# Altium footprint library CAD_Footprints.PcbLib: 27 footprints (part 2 of 2)
Each footprint in its own frame and in the unit in brackets; x right, y up, seen from the top. Pads: shape width x height; smd on the part's side, far side on the other; paste and mask are expansions set on the pad; w line width, h text height; cw(c..) or ccw(c..) is an arc to the next point about the centre after c.
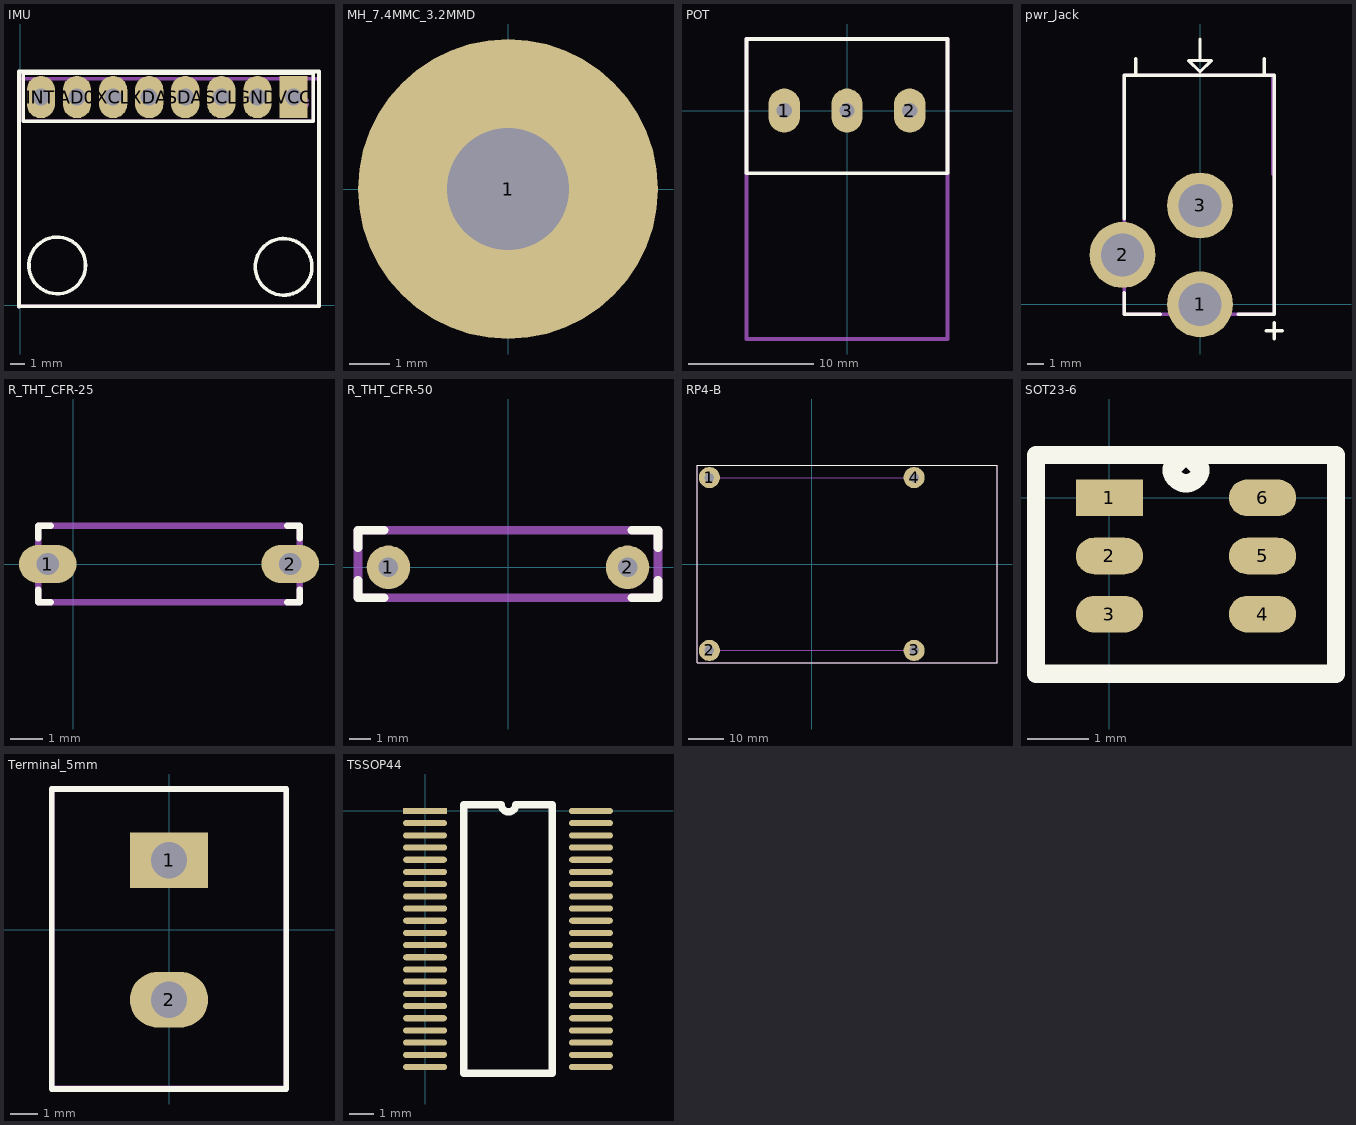
[diagram p1: the footprints below, top view; thin cyan lines are the x and y axes]

## IMU [mm]
pads (8):
  oval 2x3 hole 1.2: AD0(4,14.7) GND(16.75,14.7) INT(1.45,14.7) SCL(14.2,14.7) SDA(11.65,14.7) XCL(6.55,14.7) XDA(9.1,14.7)
  rect 2x3 hole 1.2: VCC(19.3,14.7)
Top Overlay:
  circle w0.254: c18.6,2.7 r2
  circle w0.254: c2.6,2.8 r2
  lines w0.254: -0.1,-0.1 21.1,-0.1 21.1,16.5 -0.1,16.5 -0.1,-0.1 ; 0.2,13 0.2,16.4 20.7,16.4 20.7,13 0.2,13
Mechanical 2:
  circle w0.8: c19.8,14.3 r0.2
  lines w0.254: -0.1,-0.1 -0.1,16 21.1,16 21.1,-0.1 -0.1,-0.1 ; 0.2,13 20.7,13 20.7,16.4 0.2,16.4 0.2,13
  text ".Designator" at 6.3,7.2 h2.8
3D body "m20-7820842_asm.stp": height 8.5, standoff -3, extent 0.05,13.45 20.77,15.95
3D body "User Library-MPU 6050 IMU.STEP": height 14.94, standoff 3.77, extent 0,0 21.107,15.875

## MH_7.4MMC_3.2MMD [mm]
pads (1):
  round 7.4 hole 3: 1(0,0)

## PCBComponent_1 [mm]

## POT [mm]
pads (3):
  oval 2.5x3.5 hole 1.2: 1(-5,0) 2(5,0) 3(0,0)
Top Overlay:
  lines w0.3: -8,-5 -8,5.7 8,5.7 8,-5 -8,-5
Mechanical 2:
  lines w0.3: -7.9,5.7 -8,5.7 ; -8,5.7 -8,-18.2 8,-18.2 8,5.7 -8,5.7
  text ".Designator" at -7.6,3.2 h1.5
3D body "Potentiometer.step": height 21, standoff -3.5, extent -8,-18.2 8,5.8

## pwr_Jack [mm]
pads (3):
  round 4 hole 2.6: 1(0,0) 2(-4.7,3) 3(0,6)
Top Overlay:
  lines w0.2: -4.6,0.7 -4.6,-0.6 -2.4,-0.6 ; -4.6,5.2 -4.6,13.9 4.5,13.9 4.5,-0.6 2.3,-0.6 ; -3.9,13.9 -3.9,14.9 ; 0,14.8 0,16.1 ; 3.9,13.9 3.9,14.9 ; 4,-1.6 5,-1.6 ; 4.5,-2.1 4.5,-1.1 ; -0.7,14.8 0,14.1 0.7,14.8 -0.7,14.8
Mechanical 2:
  lines w0.2: 4.4,-0.6 -4.6,-0.6 -4.6,13.9 4.4,13.9 4.4,7.9 ; 4.5,-0.6 4.5,13.9
  text ".Designator" at -1.8,8.8 h3
3D body "User Library-DC-10A.step": height 11.01, standoff -3.49, extent -4.8,-0.6 4.5,13.8

## R_THT_CFR-25 [mm]
pads (2):
  oval 1.8x1.2 hole 0.7: 1(-0.8,0) 2(6.8,0)
Top Overlay:
  lines w0.2: -1.1,-0.8 -1.1,-1.2 -0.7,-1.2 ; -1.1,0.8 -1.1,1.2 -0.7,1.2 ; 6.7,-1.2 7.1,-1.2 7.1,-0.8 ; 6.7,1.2 7.1,1.2 7.1,0.8
Mechanical 2:
  lines w0.2: -1.1,-1.2 -1.1,1.2 7.1,1.2 7.1,-1.2 -1.1,-1.2
  text ".Designator" at 0.7,-0.4 h1
3D body: height 1.71, standoff -0.42, extent 4.1,-1.075 4.5,1.061
3D body "User Library-CFR-25 CFR50S (300mils)-2.STEP": height 1.9, standoff -3.38, extent -1.085,-1.2 7.085,1.2
3D body: height 1.71, standoff -0.42, extent 3.1,-1.075 3.5,1.061
3D body: height 1.71, standoff -0.42, extent 2.3,-1.075 2.7,1.061
3D body: height 1.71, standoff -0.42, extent 1.5,-1.075 1.9,1.061

## R_THT_CFR-50 [mm]
pads (2):
  round 2 hole 0.9: 1(-5.5,0) 2(5.5,0)
Top Overlay:
  lines w0.4: -6.9,-0.6 -6.9,-1.4 -5.7,-1.4 ; -6.9,0.9 -6.9,1.7 -5.7,1.7 ; 5.7,-1.4 6.9,-1.4 6.9,-0.6 ; 5.7,1.7 6.9,1.7 6.9,0.9
Mechanical 2:
  lines w0.4: -6.9,-1.4 -6.9,1.7 6.9,1.7 6.9,-1.4 -6.9,-1.4
  text ".Designator" at -4,-0.4 h1.5
3D body "c-1623932-5-ba-3d.stp": height 3.05, standoff -0.05, extent -7.4,-1.35 7.6,1.75

## RP4-B [mm]
pads (4):
  round 6 hole 2.7: 1(-29,24.5) 2(-29,-24.5) 3(29,-24.5) 4(29,24.5)
Top Overlay:
  lines w0.3: -32.5,-28 -32.5,28 52.5,28 52.5,-28 -32.5,-28
Mechanical 2:
  lines w0.3: -29,-24.5 29,-24.5 ; -29,24.5 29,24.5 ; -32.5,-28 52.5,-28 52.5,28 -32.5,28 -32.5,-28
  text ".Designator" at -25.3,-4.301 h7.5
3D body "Raspberry Pi 4 Model B.STEP": height 17, standoff -2.9, extent -32.5,-30.4 56.49,28

## SOT23-6 [mm]
pads (6):
  rect 1.1x0.6 smd: 1(0,0)
  oval 1.1x0.6 smd: 2(0,-0.95) 3(0,-1.9) 4(2.5,-1.9) 5(2.5,-0.95) 6(2.5,0)
Top Overlay:
  lines w0.3: -1.2,-2.875 -1.2,0.7 1.262,0.7 1.488,0.475 cw(c1.25,0.475) 1.012,0.475 1.238,0.7 3.7,0.7 3.7,-2.875 2.475,-2.875 0.025,-2.875 -1.2,-2.875
3D body "sot-23-6.stp": height 1.15, standoff 0.04, extent -0.222,-2.461 2.622,0.46

## Terminal_5mm [mm]
pads (2):
  rect 2.8x2 hole 1.3: 1(0,2.5)
  oval 2.8x2 hole 1.3: 2(0,-2.5)
Top Overlay:
  lines w0.2: -4.2,-5.7 -4.2,5.05 4.2,5.05 4.2,-5.7 -4.2,-5.7
Mechanical 2:
  lines w0.2: -4.2,-5.675 -4.2,5.05 4.2,5.05 4.2,-5.675 -4.2,-5.675
  text ".Designator" at -2.45,-1.175 h3
3D body "1729018.stp": height 10.01, standoff -3.49, extent -4.075,-5.585 4.075,4.985

## TSSOP44 [mm]
pads (44):
  rect 1.8x0.25 smd: 1(0,0)
  oval 1.8x0.25 smd: 2(0,-0.5) 3(0,-1) 4(0,-1.5) 5(0,-2) 6(0,-2.5) 7(0,-3) 8(0,-3.5) 9(0,-4) 10(0,-4.5) 11(0,-5) 12(0,-5.5) 13(0,-6) 14(0,-6.5) 15(0,-7) 16(0,-7.5) 17(0,-8) 18(0,-8.5) 19(0,-9) 20(0,-9.5) 21(0,-10) 22(0,-10.5) 23(6.8,-10.5) 24(6.8,-10) 25(6.8,-9.5) 26(6.8,-9) 27(6.8,-8.5) 28(6.8,-8) 29(6.8,-7.5) 30(6.8,-7) 31(6.8,-6.5) 32(6.8,-6) 33(6.8,-5.5) 34(6.8,-5) 35(6.8,-4.5) 36(6.8,-4) 37(6.8,-3.5) 38(6.8,-3) 39(6.8,-2.5) 40(6.8,-2) 41(6.8,-1.5) 42(6.8,-1) 43(6.8,-0.5) 44(6.8,0)
Top Overlay:
  lines w0.3: 3.122,0.25 1.585,0.25 1.585,-10.75 5.215,-10.75 5.215,0.25 3.711,0.25 cw(c3.422,0.25) 3.132,0.25